# Altium footprint library MODULE_MISC.PcbLib: 33 footprints (part 3 of 3)
Each footprint in its own frame and in the unit in brackets; x right, y up, seen from the top. Pads: shape width x height; smd on the part's side, far side on the other; paste and mask are expansions set on the pad; w line width, h text height; cw(c..) or ccw(c..) is an arc to the next point about the centre after c.
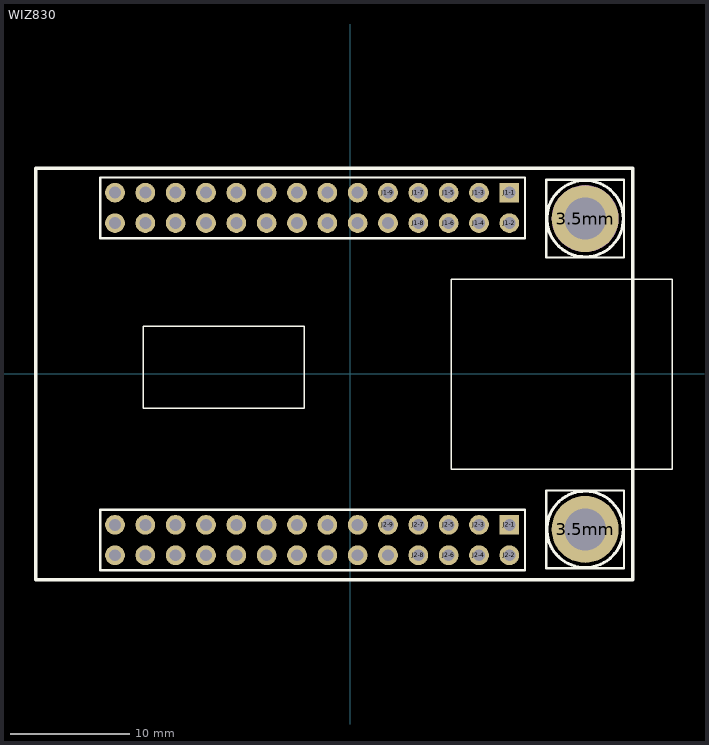
[diagram p2: the footprint, top view; thin cyan lines are the x and y axes]

## WIZ830 [mil]
pads (58):
  round 220.47 hole 137.8: 3.5mm(775,-512.3) 3.5mm(775,512.1)
  rect 65x65 hole 39.37: J1-1(525,597.7) J2-1(525,-497.3)
  round 65 hole 39.37: J1-2(525,497.3) J1-3(425,597.7) J1-4(425,497.3) J1-5(325,597.7) J1-6(325,497.3) J1-7(225,597.7) J1-8(225,497.3) J1-9(125,597.7) J1-10(125,497.3) J1-11(25,597.7) J1-12(25,497.3) J1-13(-75,597.7) J1-14(-75,497.3) J1-15(-175,597.7) J1-16(-175,497.3) J1-17(-275,597.7) J1-18(-275,497.3) J1-19(-375,597.7) J1-20(-375,497.3) J1-21(-475,597.7) J1-22(-475,497.3) J1-23(-575,597.7) J1-24(-575,497.3) J1-25(-675,597.7) J1-26(-675,497.3) J1-27(-775,597.7) J1-28(-775,497.3) J2-2(525,-597.7) J2-3(425,-497.3) J2-4(425,-597.7) J2-5(325,-497.3) J2-6(325,-597.7) J2-7(225,-497.3) J2-8(225,-597.7) J2-9(125,-497.3) J2-10(125,-597.7) J2-11(25,-497.3) J2-12(25,-597.7) J2-13(-75,-497.3) J2-14(-75,-597.7) J2-15(-175,-497.3) J2-16(-175,-597.7) J2-17(-275,-497.3) J2-18(-275,-597.7) J2-19(-375,-497.3) J2-20(-375,-597.7) J2-21(-475,-497.3) J2-22(-475,-597.7) J2-23(-575,-497.3) J2-24(-575,-597.7) J2-25(-675,-497.3) J2-26(-675,-597.7) J2-27(-775,-497.3) J2-28(-775,-597.7)
Top Overlay:
  circle w10: c775,-512.3 r125.98
  circle w5: c774.52,-512.27 r59.06
  circle w5: c774.52,511.35 r59.06
  circle w10: c775,512.1 r125.98
  lines w5: -682.17,-113.57 -682.17,157.02 -150.68,157.02 -150.68,-113.57 -682.17,-113.57 ; 333.57,-313.45 1061.92,-313.45 1061.92,312.54 333.57,312.54 333.57,-313.45
  lines w7.87: -823.4,-647.3 576.6,-647.3 576.6,-447.3 -823.4,-447.3 -823.4,-647.3 ; -823.4,447.7 -823.4,647.7 576.6,647.7 576.6,447.7 -823.4,447.7 ; 647,-640.3 647,-384.3 903,-384.3 903,-640.3 647,-640.3 ; 647,384.1 903,384.1 903,640.1 647,640.1 647,384.1
  lines w11.81: -1036,-679.04 -1036,678.84 932,678.84 932,-679.04 -1036,-679.04
Keep-Out Layer:
  circle w39.37: c775,512.1 r78.74
Mechanical 7:
  circle w3.94: c775,512.18 r106.3
  circle w47.24: c775,512.1 r86.61
  circle w3.94: c775,-512.38 r106.3
  region: 755.28,575.09 711.97,575.09 711.97,543.59 755.28,543.59
  region: 743.49,531.76 743.49,575.07 712,575.07 712,531.76
  region: 733.03,565.85 721.22,554.04 743.49,531.76 755.3,543.58
  region: 837.98,531.76 837.98,575.07 806.48,575.07 806.48,531.76
  rectangle: 794.67,543.57 837.98,575.06
  region: 828.73,554.05 816.92,565.86 794.65,543.59 806.46,531.78
  rectangle: 794.67,449.09 837.98,480.58
  region: 816.9,458.3 828.71,470.11 806.44,492.38 794.63,480.57
  region: 712,492.39 712,449.09 743.49,449.09 743.49,492.39
  region: 755.3,480.58 712,480.58 712,449.09 755.3,449.09
  region: 721.22,470.14 733.03,458.33 755.3,480.6 743.49,492.41
  region: 743.47,-492.63 755.29,-480.82 733.01,-458.55 721.2,-470.36
  region: 755.31,-449.31 712,-449.31 712,-480.81 755.31,-480.81
  region: 743.49,-492.61 743.49,-449.31 712,-449.31 712,-492.61
  region: 794.65,-480.8 806.46,-492.61 828.73,-470.34 816.92,-458.53
  rectangle: 794.67,-480.82 837.98,-449.32
  region: 806.48,-531.99 794.67,-543.8 816.94,-566.07 828.75,-554.26
  rectangle: 794.67,-575.29 837.98,-543.8
  region: 806.48,-531.99 806.48,-575.3 837.98,-575.3 837.98,-531.99
  region: 755.31,-543.8 743.5,-531.99 721.23,-554.26 733.04,-566.07
  region: 712,-531.98 712,-575.29 743.49,-575.29 743.49,-531.98
  region: 755.3,-543.79 712,-543.79 712,-575.29 755.3,-575.29